# Altium schematic symbol library relay.SCHLIB: 425 symbols (part 1 of 3) (continued)
## JJM1A-12V
designator K?, comment HALF-SIZE AUTOMOTIVE RELAY NAiS   Source: http://www.mew-europe.com/.. en_ds_61210_0001.pdf
OC_FARNELL: unknown; OC_NEWARK: unknown
footprint JJM1A
part A pins: 1, 2
part B pins: C P, NO S

## JJM2W-12V
designator K?, comment DOUBLE MAKE CONTACT AUTOMOTIVE RELAY NAiS   Source: http://www.mew-europe.com/.. en_ds_61210_0002.pdf
OC_FARNELL: unknown; OC_NEWARK: unknown
footprint JJM
part A pins: 1, 2
part B pins: C, NO1, NO2

## JS-M1*
designator K?, comment Automotive Ultra-Miniature Power Relay NAiS   Source: http://www.mew-europe.com/.. en_ds_61211_0000.pdf
MPN: JSM1-12V-4; MPN: JSM1-12V-5; MF: FARNELL; OC_FARNELL: 910338; OC_NEWARK: 13P4552; OC_FARNELL: 910351; OC_NEWARK: 14J1764; OC_FARNELL: unknown; OC_NEWARK: unknown
footprint JS-M
part A pins: 1, 2
part B pins: C P, NC O, NO S

## JS-M1A*
designator K?, comment Automotive Ultra-Miniature Power Relay NAiS   Source: http://www.mew-europe.com/.. en_ds_61211_0000.pdf
MPN: JSM1A-12V-4; MPN: JSM1A-12V-5; OC_FARNELL: unknown; OC_NEWARK: 13P4554; OC_NEWARK: 13P4555; OC_NEWARK: unknown
footprint JS-M1A
part A pins: 1, 2
part B pins: C P, NO S

## JT1A?-*
designator K?, comment COMPACT ECONOMICAL 30 AMP. RELAY NAiS   Source: http://www.mew-europe.com/.. en_ds_61212_0000.pdf
OC_FARNELL: unknown; OC_NEWARK: unknown
footprint JT1A
part A pins: 1, 2
part B pins: C P, NO S

## JT1A?-*-PCB
designator K?, comment COMPACT ECONOMICAL 30 AMP. RELAY NAiS   Source: http://www.mew-europe.com/.. en_ds_61212_0000.pdf
OC_FARNELL: unknown; OC_NEWARK: unknown
footprint JT1A-PCB
part A pins: 1, 2
part B pins: C P, NO S

## JT1A?-*-TMB
designator K?, comment COMPACT ECONOMICAL 30 AMP. RELAY NAiS   Source: http://www.mew-europe.com/.. en_ds_61212_0000.pdf
OC_FARNELL: unknown; OC_NEWARK: unknown
footprint JT1A-TMB
part A pins: 1, 2
part B pins: C P, NO S

## JT?-*
designator K?, comment COMPACT ECONOMICAL 30 AMP. RELAY NAiS   Source: http://www.mew-europe.com/.. en_ds_61212_0000.pdf
OC_FARNELL: unknown; OC_NEWARK: unknown
footprint JT
part A pins: 1, 2
part B pins: C P, NC O, NO S

## JT?-*N-PCB
designator K?, comment COMPACT ECONOMICAL 30 AMP. RELAY NAiS   Source: http://www.mew-europe.com/.. en_ds_61212_0000.pdf
OC_FARNELL: unknown; OC_NEWARK: unknown
footprint JT-PCB
part A pins: 1, 2
part B pins: C P, NC O, NO S

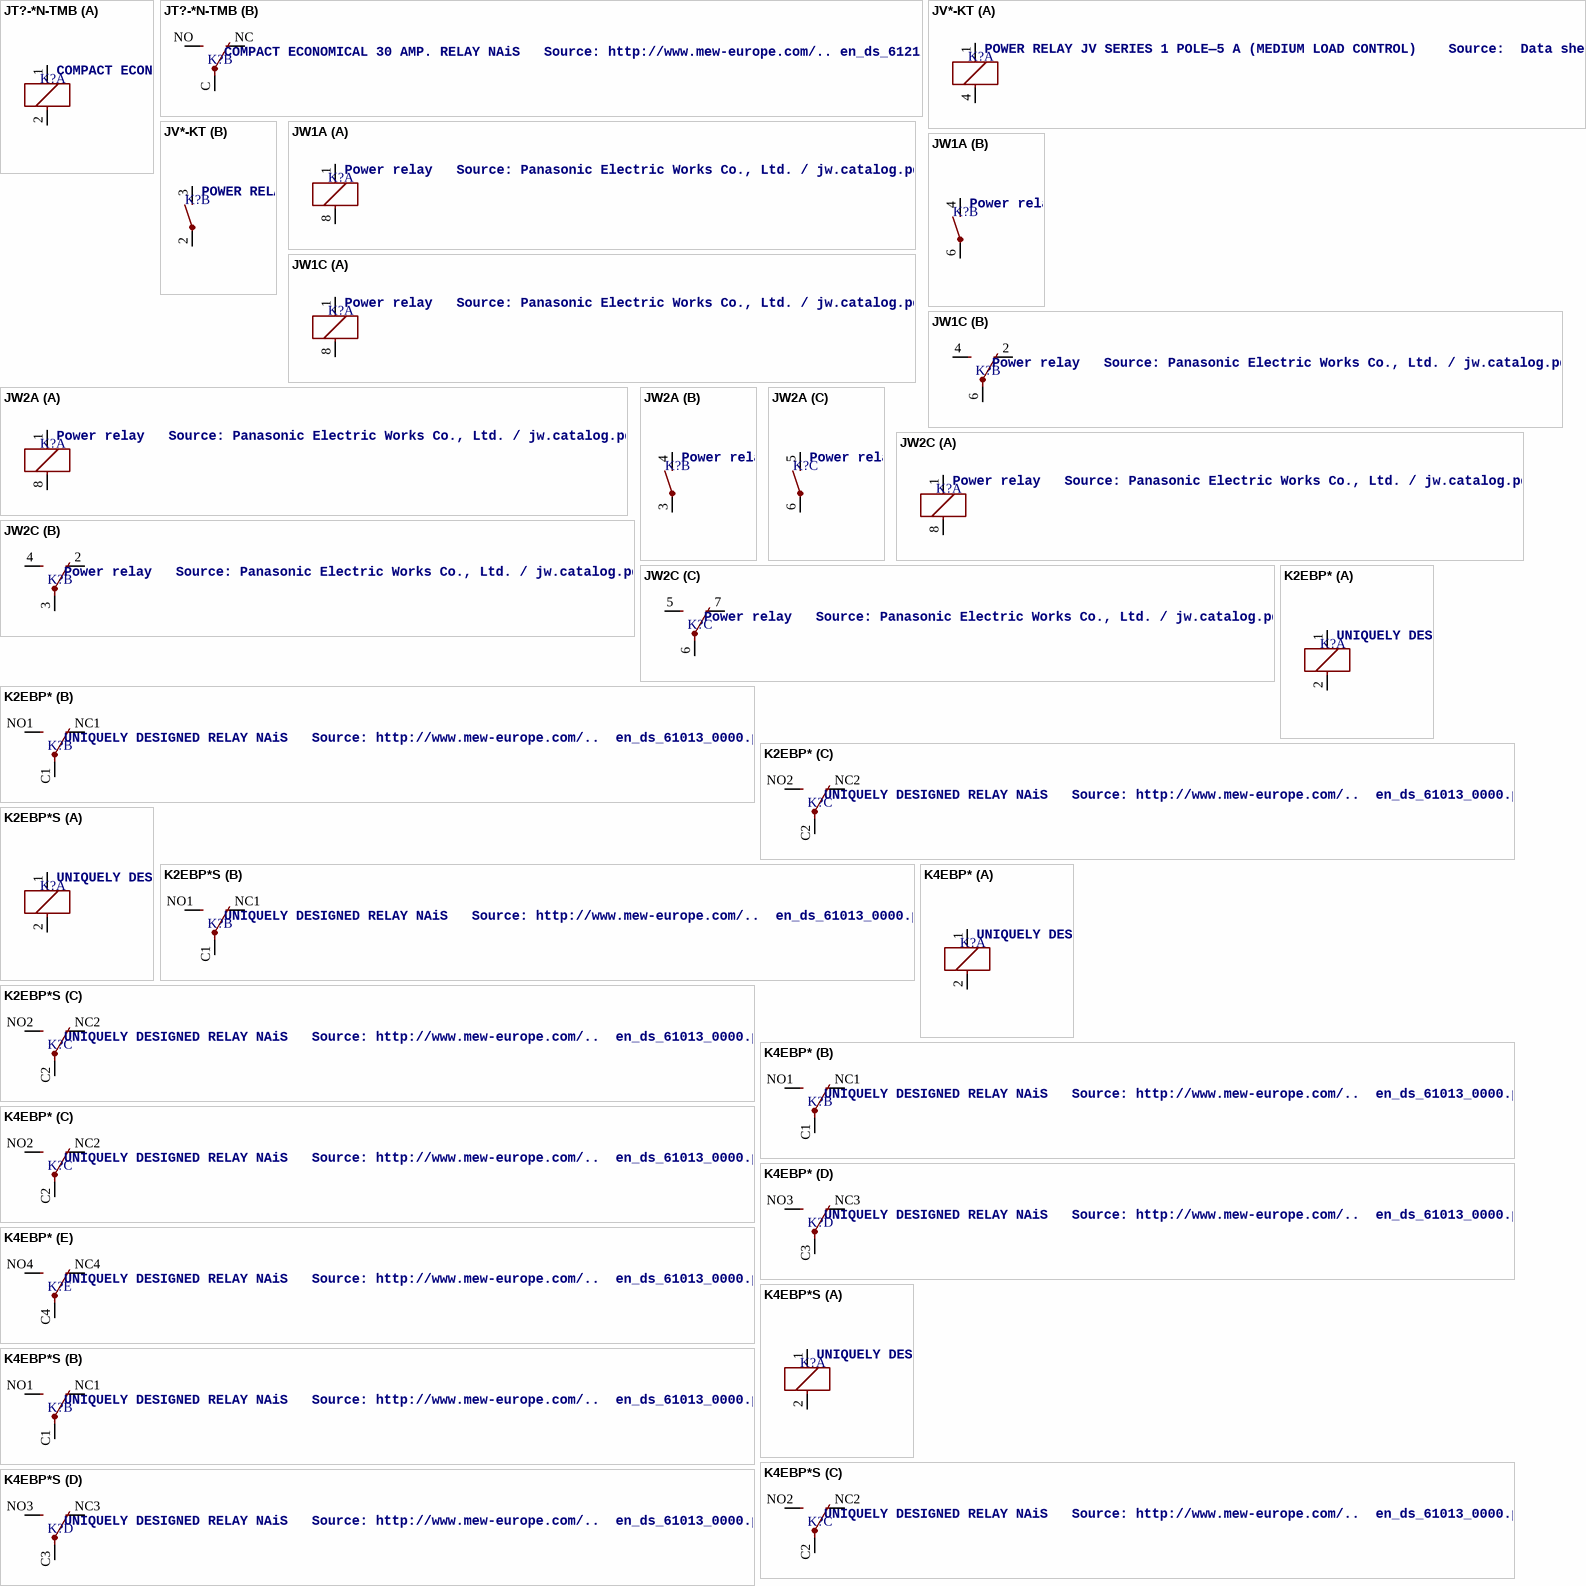
[diagram p14: symbols JT?-*N-TMB to K4EBP*S]

## JT?-*N-TMB
designator K?, comment COMPACT ECONOMICAL 30 AMP. RELAY NAiS   Source: http://www.mew-europe.com/.. en_ds_61212_0000.pdf
OC_FARNELL: unknown; OC_NEWARK: unknown
footprint JT-TMB
part A pins: 1, 2
part B pins: C P, NC O, NO S

## JV*-KT
designator K?, comment POWER RELAY JV SERIES 1 POLE—5 A (MEDIUM LOAD CONTROL)    Source:  Data sheet
footprint JV-KT
part A pins: 1, 4 2
part B pins: 2 P, 3 S

## JW1A
designator K?, comment Power relay   Source: Panasonic Electric Works Co., Ltd. / jw.catalog.pdf
footprint JW1A
part A pins: 1, 8 2
part B pins: 4 S, 6 P

## JW1C
designator K?, comment Power relay   Source: Panasonic Electric Works Co., Ltd. / jw.catalog.pdf
footprint JW1C
part A pins: 1, 8 2
part B pins: 2 O, 4 S, 6 P

## JW2A
designator K?, comment Power relay   Source: Panasonic Electric Works Co., Ltd. / jw.catalog.pdf
footprint JW2A
part A pins: 1, 8 2
part B pins: 3 P, 4 S
part C pins: 5 S, 6 P

## JW2C
designator K?, comment Power relay   Source: Panasonic Electric Works Co., Ltd. / jw.catalog.pdf
footprint JW2C
part A pins: 1, 8 2
part B pins: 2 O, 3 P, 4 S
part C pins: 5 S, 6 P, 7 O

## K2EBP*
designator K?, comment UNIQUELY DESIGNED RELAY NAiS   Source: http://www.mew-europe.com/..  en_ds_61013_0000.pdf
OC_FARNELL: unknown; OC_NEWARK: unknown
footprint K2EBP
part A pins: 1, 2
part B pins: C1 P, NC1 O, NO1 S
part C pins: C2 P, NC2 O, NO2 S

## K2EBP*S
designator K?, comment UNIQUELY DESIGNED RELAY NAiS   Source: http://www.mew-europe.com/..  en_ds_61013_0000.pdf
OC_FARNELL: unknown; OC_NEWARK: unknown
footprint K2-PS
part A pins: 1, 2
part B pins: C1 P, NC1 O, NO1 S
part C pins: C2 P, NC2 O, NO2 S

## K4EBP*
designator K?, comment UNIQUELY DESIGNED RELAY NAiS   Source: http://www.mew-europe.com/..  en_ds_61013_0000.pdf
OC_FARNELL: unknown; OC_NEWARK: unknown
footprint K4EBP
part A pins: 1, 2
part B pins: C1 P, NC1 O, NO1 S
part C pins: C2 P, NC2 O, NO2 S
part D pins: C3 P, NC3 O, NO3 S
part E pins: C4 P, NC4 O, NO4 S

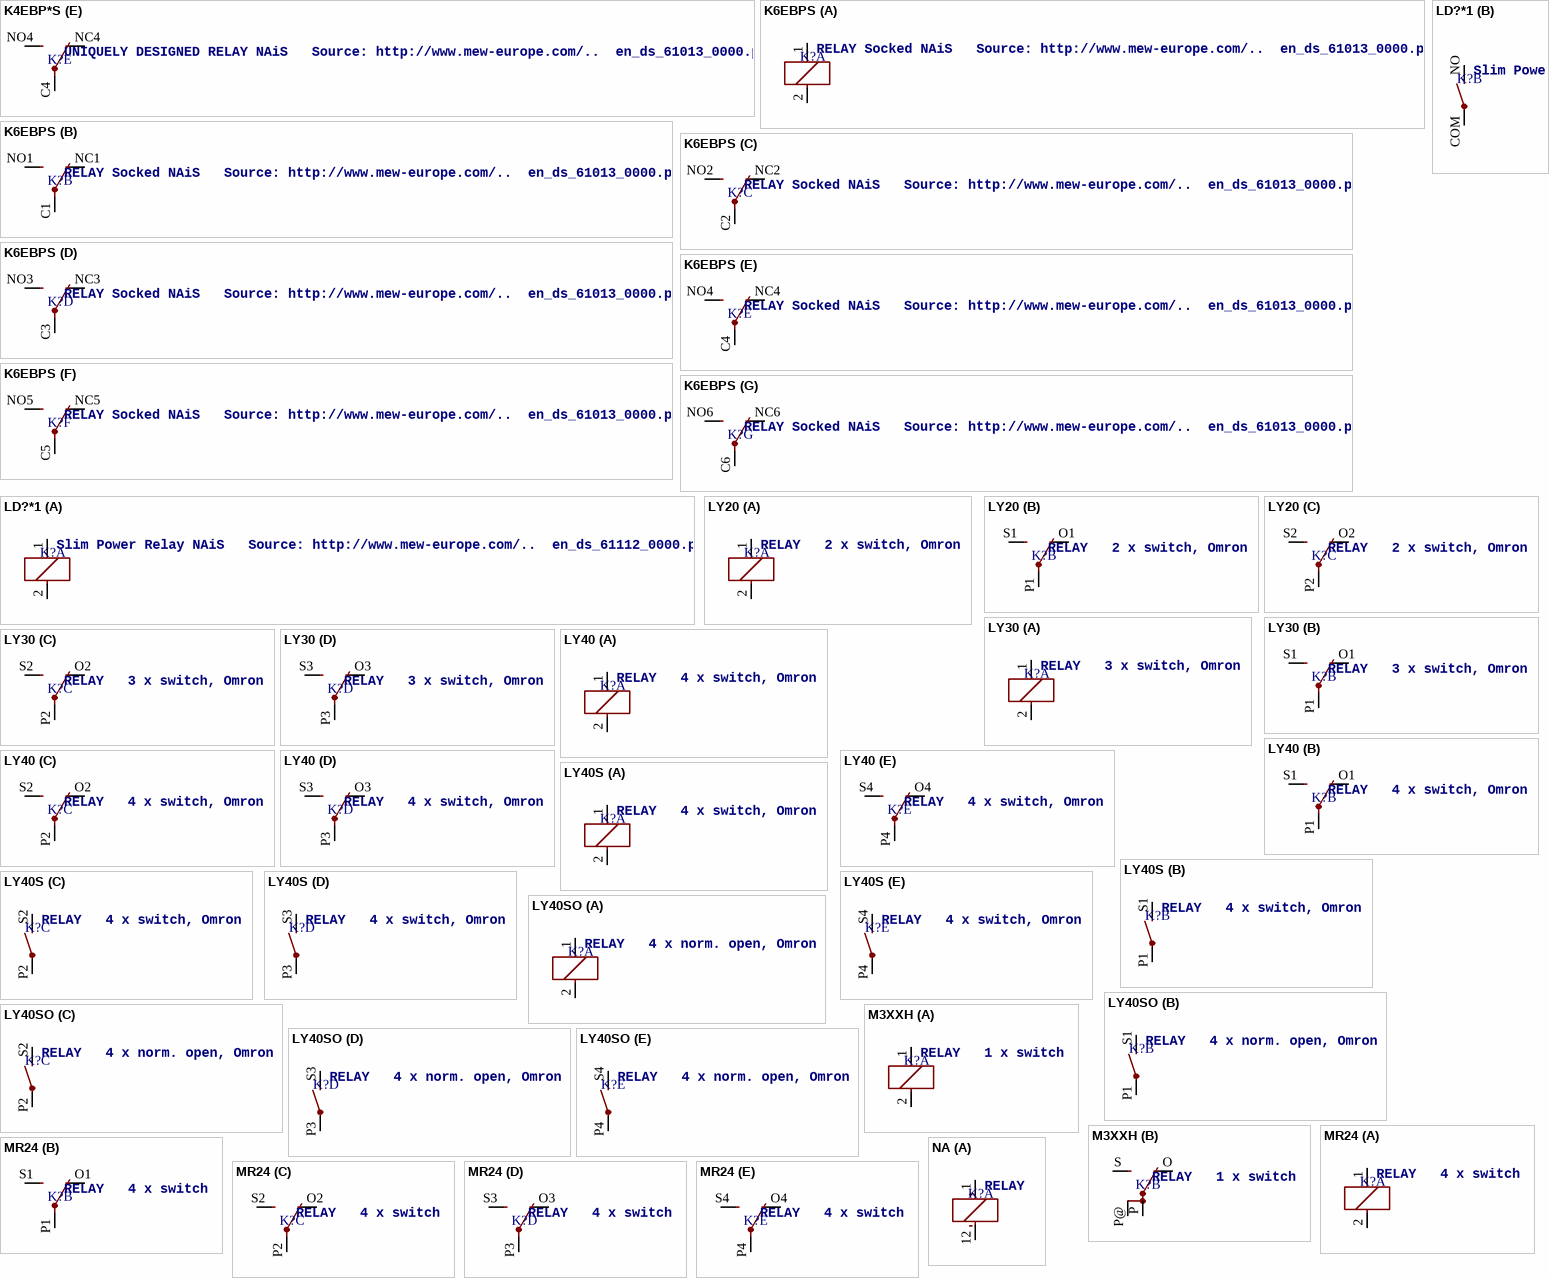
[diagram p15: symbols K4EBP*S to NA]

## K4EBP*S
designator K?, comment UNIQUELY DESIGNED RELAY NAiS   Source: http://www.mew-europe.com/..  en_ds_61013_0000.pdf
OC_FARNELL: unknown; OC_NEWARK: unknown
footprint K4-PS
part A pins: 1, 2
part B pins: C1 P, NC1 O, NO1 S
part C pins: C2 P, NC2 O, NO2 S
part D pins: C3 P, NC3 O, NO3 S
part E pins: C4 P, NC4 O, NO4 S

## K6EBPS
designator K?, comment RELAY Socked NAiS   Source: http://www.mew-europe.com/..  en_ds_61013_0000.pdf
OC_FARNELL: unknown; OC_NEWARK: unknown
footprint K6-PS
part A pins: 1, 2
part B pins: C1 P, NC1 O, NO1 S
part C pins: C2 P, NC2 O, NO2 S
part D pins: C3 P, NC3 O, NO3 S
part E pins: C4 P, NC4 O, NO4 S
part F pins: C5 P, NC5 O, NO5 S
part G pins: C6 P, NC6 O, NO6 S

## LD?*1
designator K?, comment Slim Power Relay NAiS   Source: http://www.mew-europe.com/..  en_ds_61112_0000.pdf
MPN: ALD112; MF: FARNELL; OC_FARNELL: 3727154; OC_NEWARK: unknown; OC_FARNELL: unknown; OC_FARNELL: 3727166; OC_NEWARK: 70C6003; OC_FARNELL: 3727178
footprint LD
part A pins: 1, 2
part B pins: COM P, NO S

## LY20
designator K?, comment RELAY   2 x switch, Omron
OC_FARNELL: unknown; OC_NEWARK: unknown
footprint LY20
part A pins: 1, 2
part B pins: O1 O, P1 P, S1 S
part C pins: O2 O, P2 P, S2 S

## LY30
designator K?, comment RELAY   3 x switch, Omron
OC_FARNELL: unknown; OC_NEWARK: unknown
footprint LY30
part A pins: 1, 2
part B pins: O1 O, P1 P, S1 S
part C pins: O2 O, P2 P, S2 S
part D pins: O3 O, P3 P, S3 S

## LY40
designator K?, comment RELAY   4 x switch, Omron
OC_FARNELL: unknown; OC_NEWARK: unknown
footprint LY40
part A pins: 1, 2
part B pins: O1 O, P1 P, S1 S
part C pins: O2 O, P2 P, S2 S
part D pins: O3 O, P3 P, S3 S
part E pins: O4 O, P4 P, S4 S

## LY40S
designator K?, comment RELAY   4 x switch, Omron
OC_FARNELL: unknown; OC_NEWARK: unknown
footprint LY40S
part A pins: 1, 2
part B pins: P1 P, S1 S
part C pins: P2 P, S2 S
part D pins: P3 P, S3 S
part E pins: P4 P, S4 S

## LY40SO
designator K?, comment RELAY   4 x norm. open, Omron
OC_FARNELL: unknown; OC_NEWARK: unknown
footprint LY40SO
part A pins: 1, 2
part B pins: P1 P, S1 S
part C pins: P2 P, S2 S
part D pins: P3 P, S3 S
part E pins: P4 P, S4 S

## M3XXH
designator K?, comment RELAY   1 x switch
OC_FARNELL: unknown; OC_NEWARK: unknown
footprint M3XXH
part A pins: 1, 2
part B pins: O, P, P@ P@1, S

## MR24
designator K?, comment RELAY   4 x switch
OC_FARNELL: unknown; OC_NEWARK: unknown
footprint MR24
part A pins: 1, 2
part B pins: O1 O, P1 P, S1 S
part C pins: O2 O, P2 P, S2 S
part D pins: O3 O, P3 P, S3 S
part E pins: O4 O, P4 P, S4 S

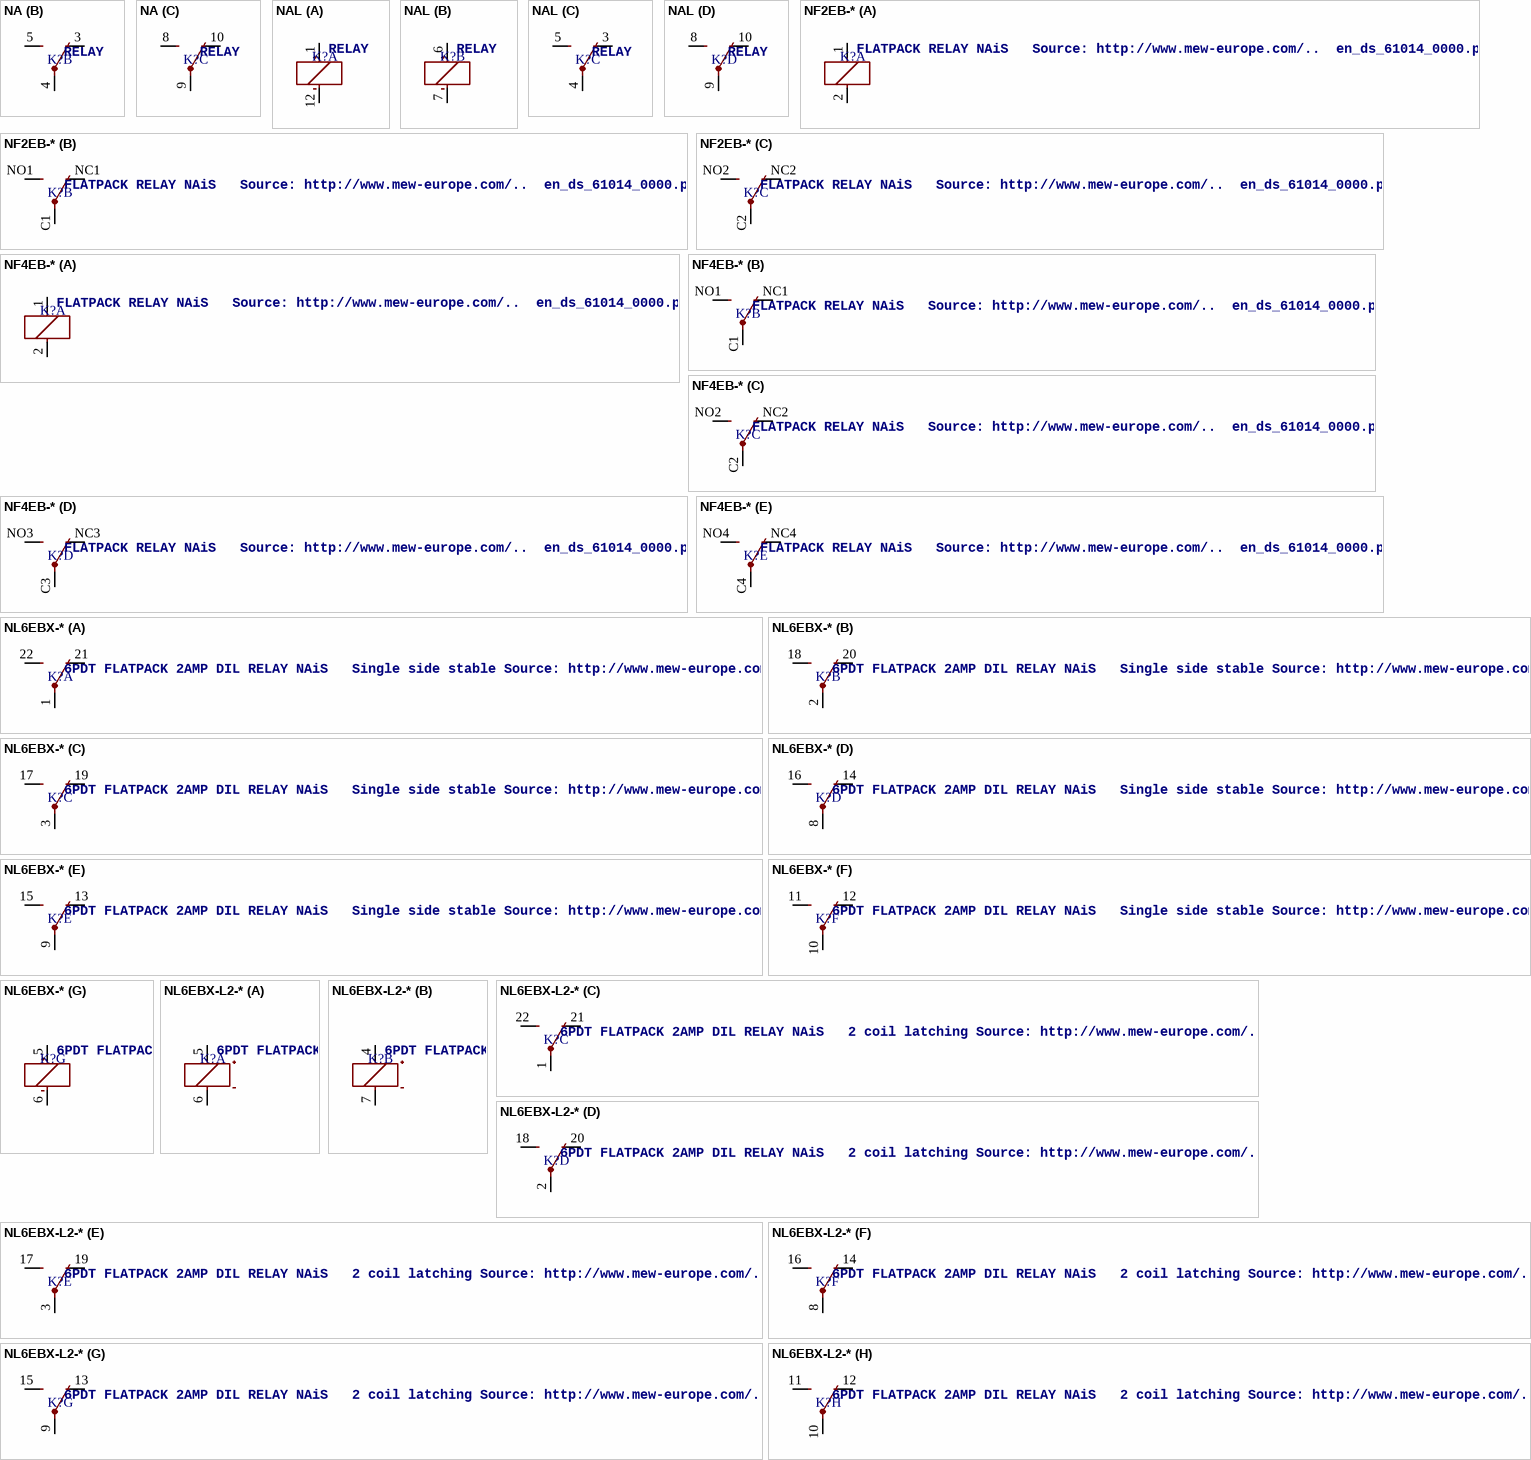
[diagram p16: symbols NA to NL6EBX-L2-*]

## NA
designator K?, comment RELAY
OC_FARNELL: unknown; OC_NEWARK: unknown
footprint NA
part A pins: 1 +, 12 -
part B pins: 3 O, 4 P, 5 S
part C pins: 8 S, 9 P, 10 O

## NAL
designator K?, comment RELAY
OC_FARNELL: unknown; OC_NEWARK: unknown
footprint NAL
part A pins: 1 +, 12 -
part B pins: 6 +, 7 -
part C pins: 3 O, 4 P, 5 S
part D pins: 8 S, 9 P, 10 O

## NF2EB-*
designator K?, comment FLATPACK RELAY NAiS   Source: http://www.mew-europe.com/..  en_ds_61014_0000.pdf
MPN: NF2EB-12V; MPN: NF2EB-24V; MPN: NF2EB-5V; MPN: NF2EB-6V; OC_FARNELL: 1200946; OC_NEWARK: 13P5536; OC_FARNELL: 1175714; OC_NEWARK: 13P5537; OC_FARNELL: unknown; OC_NEWARK: unknown; OC_FARNELL: 1703747; OC_NEWARK: 13P5538; OC_NEWARK: 13P5539
footprint NF2
part A pins: 1, 2
part B pins: C1 P, NC1 O, NO1 S
part C pins: C2 P, NC2 O, NO2 S

## NF4EB-*
designator K?, comment FLATPACK RELAY NAiS   Source: http://www.mew-europe.com/..  en_ds_61014_0000.pdf
MPN: NF4EB-12V; MPN: NF4EB-24V; MPN: NF4EB-48V; MPN: NF4EB-5V; MPN: NF4EB-6V; MF: AROMAT/ MATSUSHITA; OC_FARNELL: 1175715; OC_NEWARK: 13P5540; OC_FARNELL: 1373470; OC_NEWARK: 13P5541; OC_FARNELL: unknown; OC_NEWARK: 13P5542; OC_FARNELL: 1200947; OC_NEWARK: 13P5543; OC_NEWARK: 46F5739
footprint NF4
part A pins: 1, 2
part B pins: C1 P, NC1 O, NO1 S
part C pins: C2 P, NC2 O, NO2 S
part D pins: C3 P, NC3 O, NO3 S
part E pins: C4 P, NC4 O, NO4 S

## NL6EBX-*
designator K?, comment 6PDT FLATPACK 2AMP DIL RELAY NAiS   Single side stable Source: http://www.mew-europe.com/..  en_ds_61014_0003.pdf
OC_FARNELL: unknown; OC_NEWARK: unknown
footprint NL6EBX
part A pins: 1 P, 21 O, 22 S
part B pins: 2 P, 18 S, 20 O
part C pins: 3 P, 17 S, 19 O
part D pins: 8 P, 14 O, 16 S
part E pins: 9 P, 13 O, 15 S
part F pins: 10 P, 11 S, 12 O
part G pins: 5 +, 6 -

## NL6EBX-L2-*
designator K?, comment 6PDT FLATPACK 2AMP DIL RELAY NAiS   2 coil latching Source: http://www.mew-europe.com/..  en_ds_61014_0003.pdf
OC_FARNELL: unknown; OC_NEWARK: unknown
footprint NL6EBX-L2
part A pins: 5 +, 6 -
part B pins: 4 +, 7 -
part C pins: 1 P, 21 O, 22 S
part D pins: 2 P, 18 S, 20 O
part E pins: 3 P, 17 S, 19 O
part F pins: 8 P, 14 O, 16 S
part G pins: 9 P, 13 O, 15 S
part H pins: 10 P, 11 S, 12 O

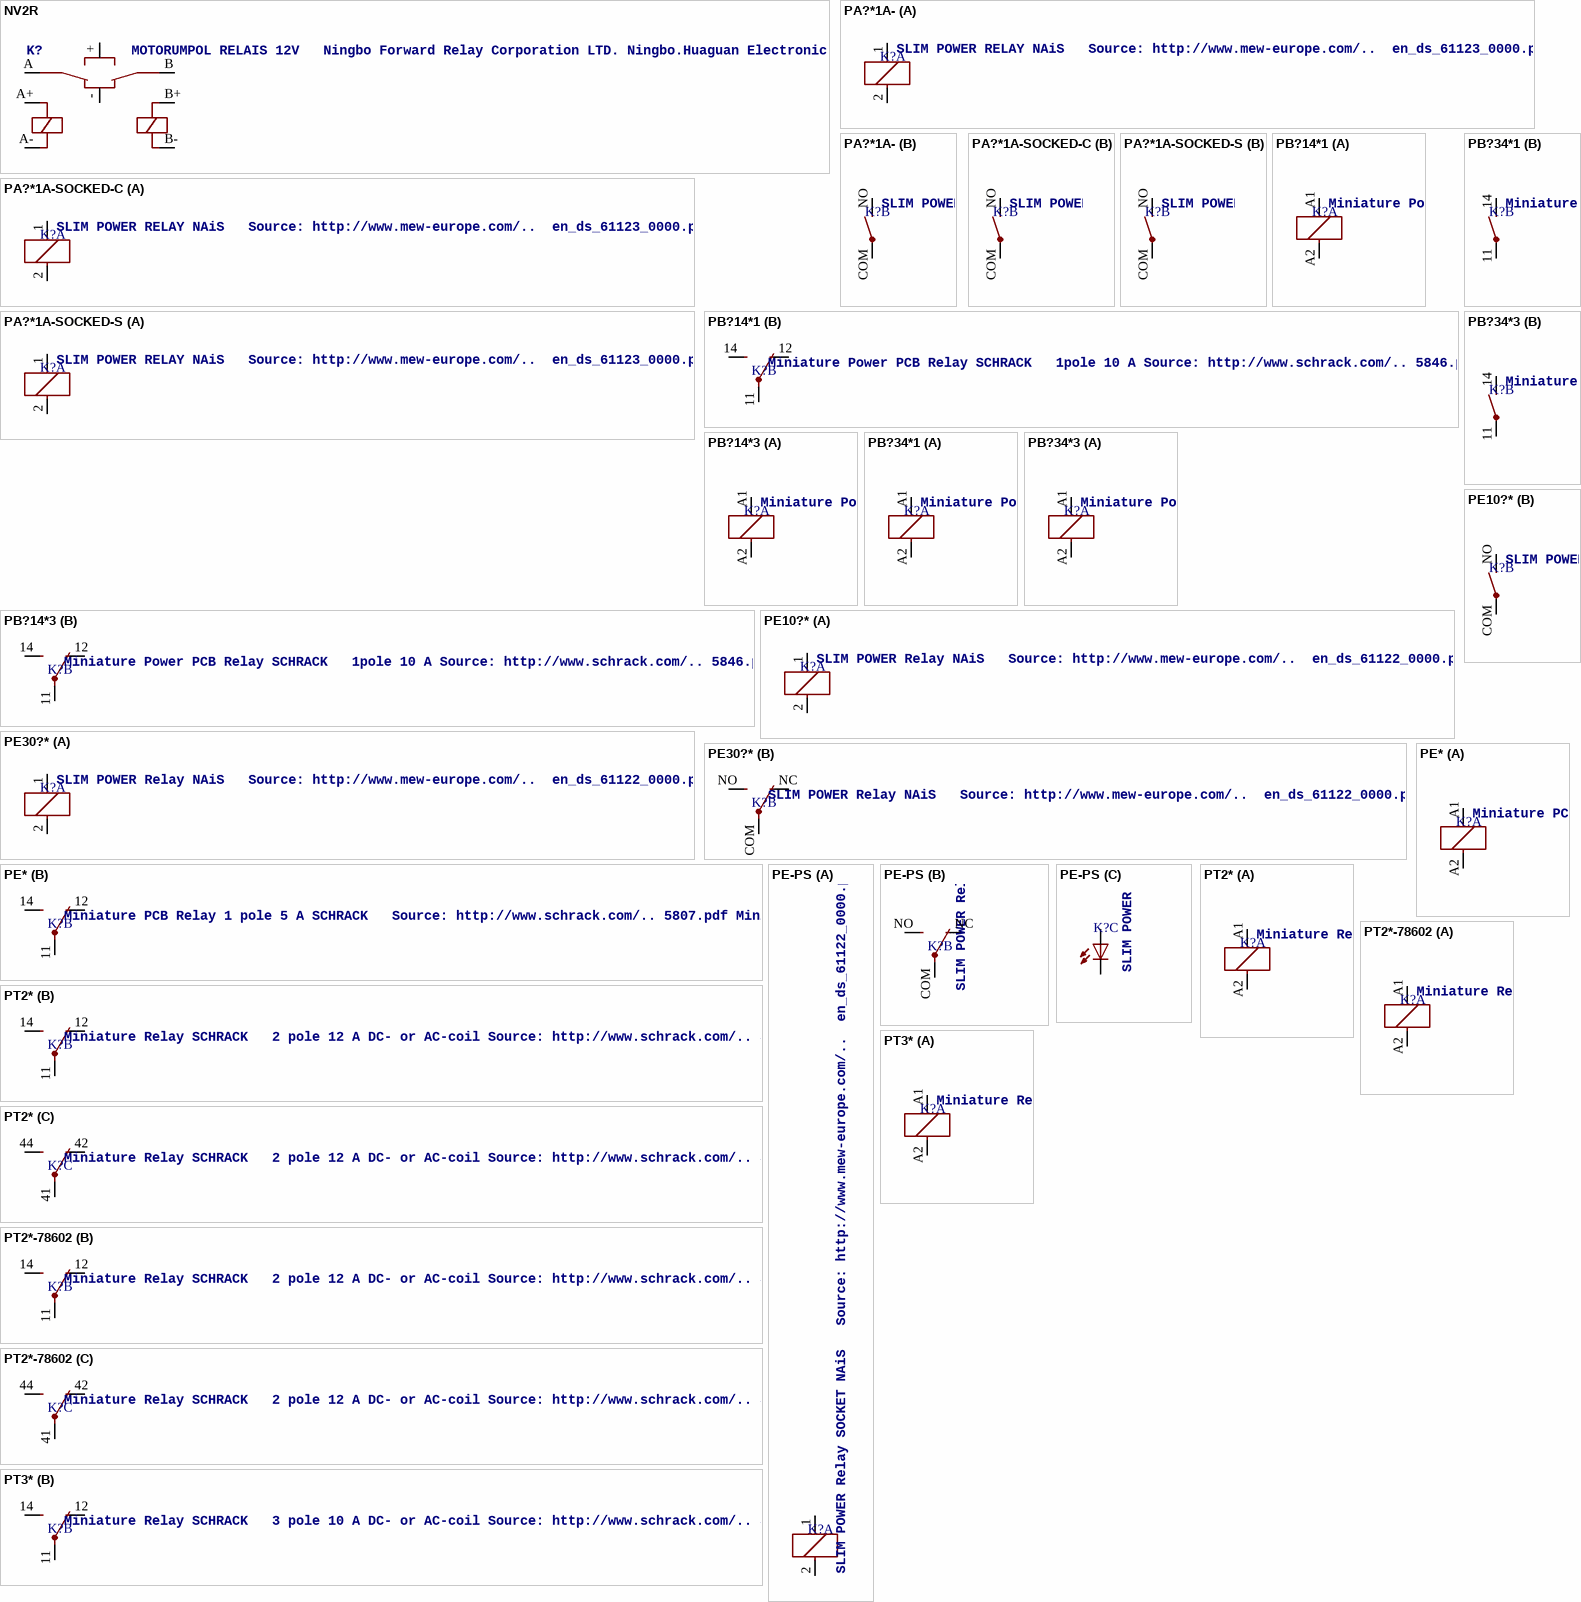
[diagram p17: symbols NV2R to PT3*]

## NV2R
designator K?, comment MOTORUMPOL RELAIS 12V   Ningbo Forward Relay Corporation LTD. Ningbo.Huaguan Electronics Corporation LTD.   Source: http://www.dblectro.com/site/pdf/NV2R.pdf   http://www2.produktinfo.conrad.com/datenblaetter/500000-524999/505013-da-01-de-Motorumpolrelais_12V.pdf Elli-Echo ER20T-S-DC12V - 20A/14VDC Conrad Nr.: 505013 - 62
OC_FARNELL: unknown; OC_NEWARK: unknown
footprint NV2R
pins: +, -, A, A+, A-, B, B+, B-

## PA?*1A-
designator K?, comment SLIM POWER RELAY NAiS   Source: http://www.mew-europe.com/..  en_ds_61123_0000.pdf
MPN: PA1A-12V-Y1; MPN: PA1A-18V; MPN: PA1A-24V; MF: AROMAT/ MATSUSHITA; OC_FARNELL: 910363; OC_NEWARK: 82H8374; OC_FARNELL: unknown; OC_NEWARK: 92B3524; OC_FARNELL: 910375; OC_NEWARK: 13P6167; OC_NEWARK: unknown
footprint PA
part A pins: 1, 2
part B pins: COM P, NO S

## PA?*1A-SOCKED-C
designator K?, comment SLIM POWER RELAY NAiS   Source: http://www.mew-europe.com/..  en_ds_61123_0000.pdf
OC_FARNELL: unknown; OC_NEWARK: unknown
footprint PA-CLI-SOCKET
part A pins: 1, 2
part B pins: COM P, NO S

## PA?*1A-SOCKED-S
designator K?, comment SLIM POWER RELAY NAiS   Source: http://www.mew-europe.com/..  en_ds_61123_0000.pdf
OC_FARNELL: unknown; OC_NEWARK: unknown
footprint PA-STD-SOCKET
part A pins: 1, 2
part B pins: COM P, NO S

## PB?14*1
designator K?, comment Miniature Power PCB Relay SCHRACK   1pole 10 A Source: http://www.schrack.com/.. 5846.pdf
MPN: PB114006; MPN: PB114012; MPN: PB114024; MF: TYCO ELECTRONICS; OC_FARNELL: 1175076; OC_NEWARK: 85C1482; OC_FARNELL: 1175077; OC_NEWARK: 34K8593; OC_FARNELL: 1175078; OC_NEWARK: 34K8594
footprint PB
part A pins: A1 1, A2 2
part B pins: 11 P, 12 O, 14 S

## PB?14*3
designator K?, comment Miniature Power PCB Relay SCHRACK   1pole 10 A Source: http://www.schrack.com/.. 5846.pdf
OC_FARNELL: unknown; OC_NEWARK: unknown
footprint PB
part A pins: A1 1, A2 2
part B pins: 11 P, 12 O, 14 S

## PB?34*1
designator K?, comment Miniature Power PCB Relay SCHRACK   1pole 10 A Source: http://www.schrack.com/.. 5846.pdf
OC_FARNELL: unknown; OC_NEWARK: unknown
footprint PB
part A pins: A1 1, A2 2
part B pins: 11 P, 14 S

## PB?34*3
designator K?, comment Miniature Power PCB Relay SCHRACK   1pole 10 A Source: http://www.schrack.com/.. 5846.pdf
OC_FARNELL: unknown; OC_NEWARK: unknown
footprint PB
part A pins: A1 1, A2 2
part B pins: 11 P, 14 S

## PE10?*
designator K?, comment SLIM POWER Relay NAiS   Source: http://www.mew-europe.com/..  en_ds_61122_0000.pdf
MPN: APE10006; MPN: APE10012; MPN: APE10018; MPN: APE10024; MPN: APE10048; MPN: APE1004H; MPN: APE10060; MPN: APE10106; MPN: APE10112; MPN: APE10118; MPN: APE10124; MPN: APE10148; MPN: APE1014H; MPN: APE10160; OC_FARNELL: unknown; OC_NEWARK: unknown; OC_NEWARK: 11N2525; OC_NEWARK: 11N2526; OC_NEWARK: 11N2527; OC_NEWARK: 11N2528; OC_NEWARK: 27M3556; OC_NEWARK: 11N2529; OC_NEWARK: 11N2530; OC_NEWARK: 11N2531; OC_NEWARK: 11N2532; OC_NEWARK: 11N2533; OC_NEWARK: 11N2534; OC_NEWARK: 11N2536; OC_NEWARK: 11N2535; OC_NEWARK: 11N2537
footprint PE-FORM-A
part A pins: 1, 2
part B pins: COM P, NO S

## PE30?*
designator K?, comment SLIM POWER Relay NAiS   Source: http://www.mew-europe.com/..  en_ds_61122_0000.pdf
MPN: APE30006; MPN: APE30012; MPN: APE30018; MPN: APE30024; MPN: APE30048; MPN: APE3004H; MPN: APE30060; MPN: APE30112; MPN: APE30118; MPN: APE30124; MPN: APE30148; MPN: APE3014H; MPN: APE30160; MF: AROMAT/ MATSUSHITA; OC_FARNELL: unknown; OC_NEWARK: unknown; OC_NEWARK: 11N2538; OC_NEWARK: 37J1097; OC_NEWARK: 11N2539; OC_FARNELL: 1703738; OC_NEWARK: 01H7899; OC_NEWARK: 11N2540; OC_NEWARK: 55M0343; OC_NEWARK: 13J1294; OC_NEWARK: 13P0932; OC_NEWARK: 11N2542; OC_NEWARK: 13P0933; OC_NEWARK: 11N2543; OC_NEWARK: 36K1690; OC_NEWARK: 11N2544
footprint PE-FORM-C
part A pins: 1, 2
part B pins: COM P, NC O, NO S

## PE*
designator K?, comment Miniature PCB Relay 1 pole 5 A SCHRACK   Source: http://www.schrack.com/.. 5807.pdf Miniature PCB Relay bistable 1pole 5 A, polarized bistable version Source: http://www.schrack.com/.. 5808.pdf
OC_FARNELL: unknown; OC_NEWARK: unknown
footprint PE
part A pins: A1 1, A2 2
part B pins: 11 P, 12 O, 14 S

## PE-PS
designator K?, comment SLIM POWER Relay SOCKET NAiS   Source: http://www.mew-europe.com/..  en_ds_61122_0000.pdf
OC_FARNELL: unknown; OC_NEWARK: unknown
footprint PE-SOCKET
part A pins: 1, 2
part B pins: COM P, NC O, NO S
part C pins: +LED A, -LED C

## PT2*
designator K?, comment Miniature Relay SCHRACK   2 pole 12 A DC- or AC-coil Source: http://www.schrack.com/.. 5823.pdf Socked 78602 Source: http://www.schrack.com/.. 5836.pdf
MPN: PT271615; MF: TYCO ELECTRONICS; OC_FARNELL: unknown; OC_NEWARK: unknown; OC_NEWARK: 96H9720
footprint PT-2
part A pins: A1 1, A2 2
part B pins: 11 P, 12 O, 14 S
part C pins: 41 P, 42 O, 44 S

## PT2*-78602
designator K?, comment Miniature Relay SCHRACK   2 pole 12 A DC- or AC-coil Source: http://www.schrack.com/.. 5823.pdf Socked 78602 Source: http://www.schrack.com/.. 5836.pdf
OC_FARNELL: unknown; OC_NEWARK: unknown
footprint PT78602
part A pins: A1 1, A2 2
part B pins: 11 P, 12 O, 14 S
part C pins: 41 P, 42 O, 44 S

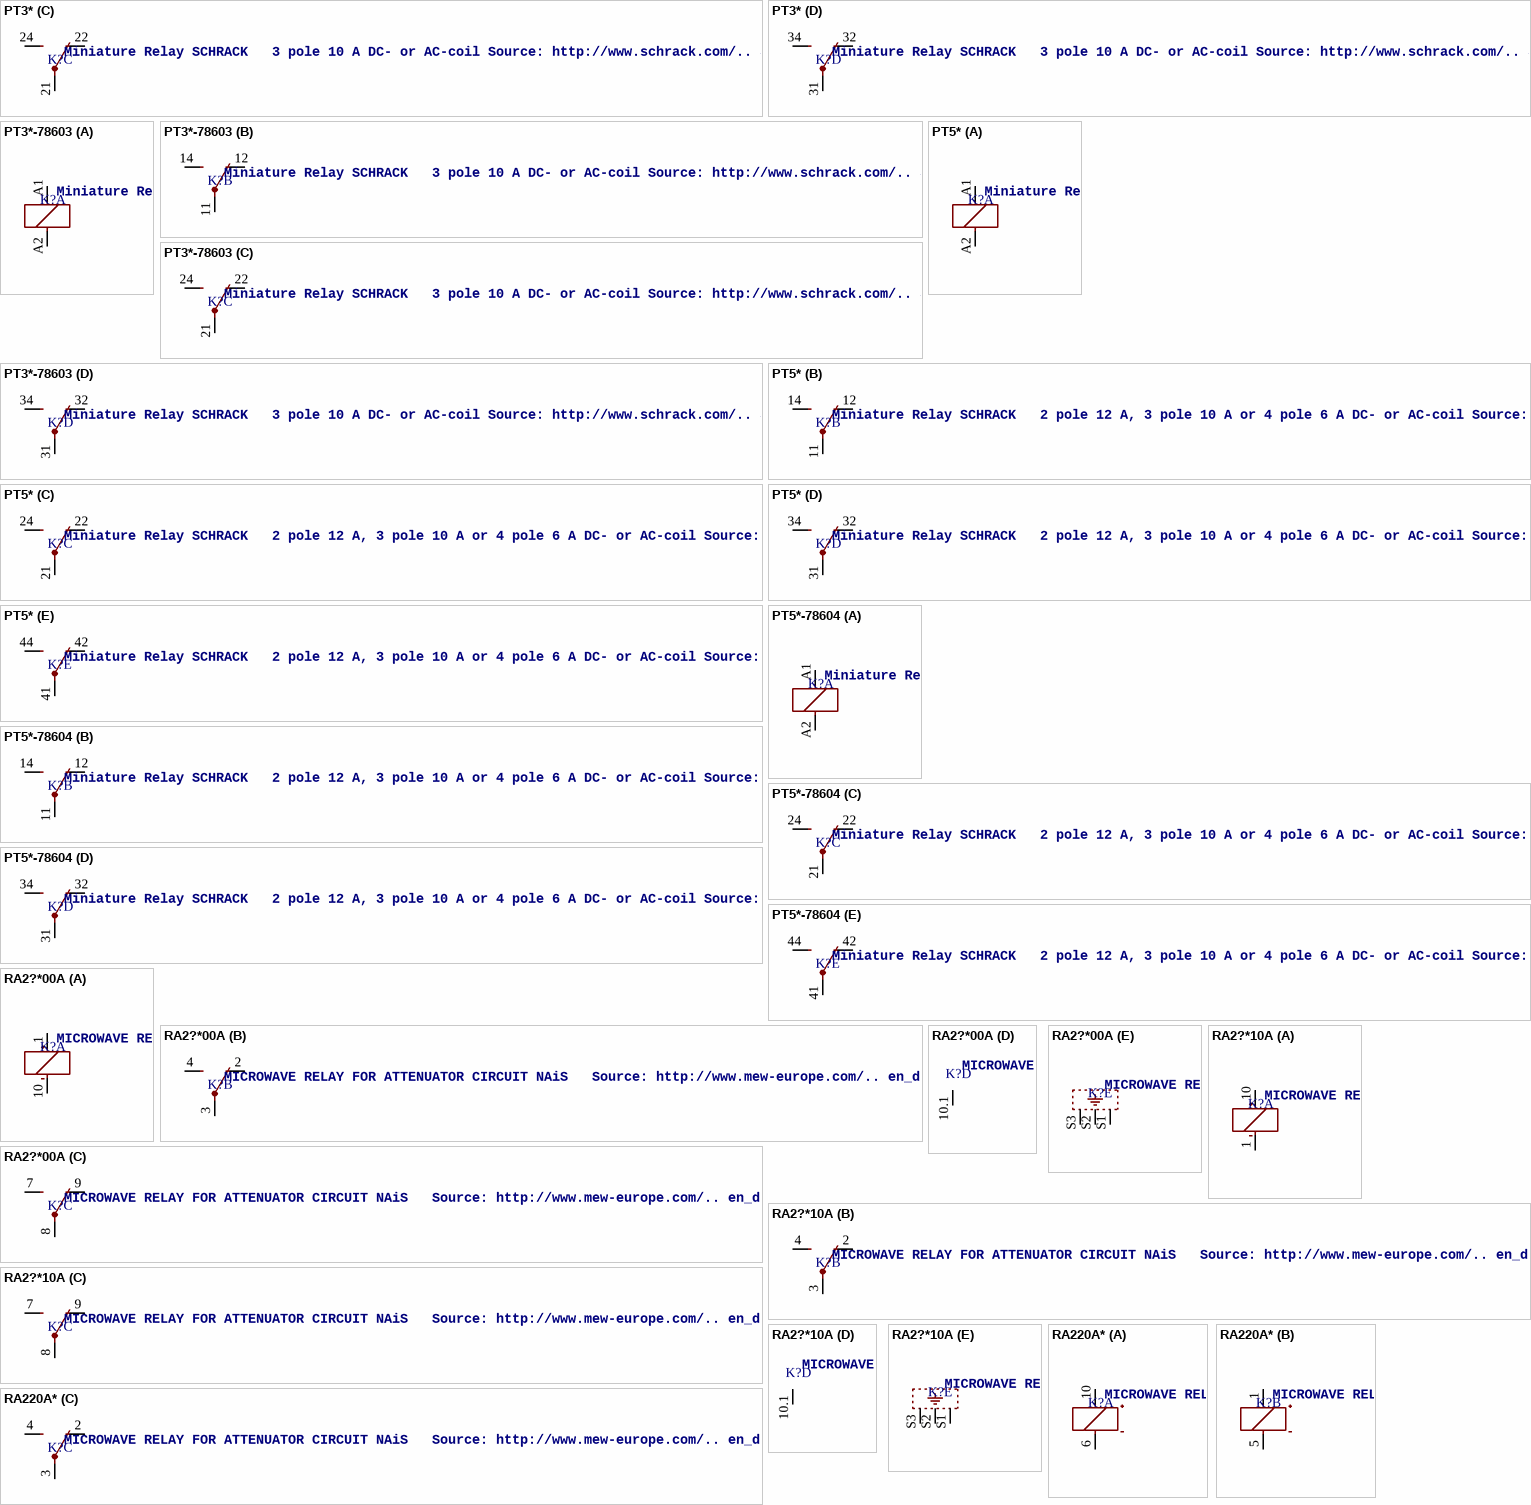
[diagram p18: symbols PT3* to RA220A*]

## PT3*
designator K?, comment Miniature Relay SCHRACK   3 pole 10 A DC- or AC-coil Source: http://www.schrack.com/.. 5823.pdf Socked 78603 Source: http://www.schrack.com/.. 5836.pdf
OC_FARNELL: unknown; OC_NEWARK: unknown
footprint PT-3
part A pins: A1 1, A2 2
part B pins: 11 P, 12 O, 14 S
part C pins: 21 P, 22 O, 24 S
part D pins: 31 P, 32 O, 34 S

## PT3*-78603
designator K?, comment Miniature Relay SCHRACK   3 pole 10 A DC- or AC-coil Source: http://www.schrack.com/.. 5823.pdf Socked 78603 Source: http://www.schrack.com/.. 5836.pdf
OC_FARNELL: unknown; OC_NEWARK: unknown
footprint PT78603
part A pins: A1 1, A2 2
part B pins: 11 P, 12 O, 14 S
part C pins: 21 P, 22 O, 24 S
part D pins: 31 P, 32 O, 34 S